# Altium footprint library Connector_PinSocket_2.54mm.PcbLib: 278 footprints (part 11 of 18)
Each footprint in its own frame and in the unit in brackets; x right, y up, seen from the top. Pads: shape width x height; smd on the part's side, far side on the other; paste and mask are expansions set on the pad; w line width, h text height; cw(c..) or ccw(c..) is an arc to the next point about the centre after c.
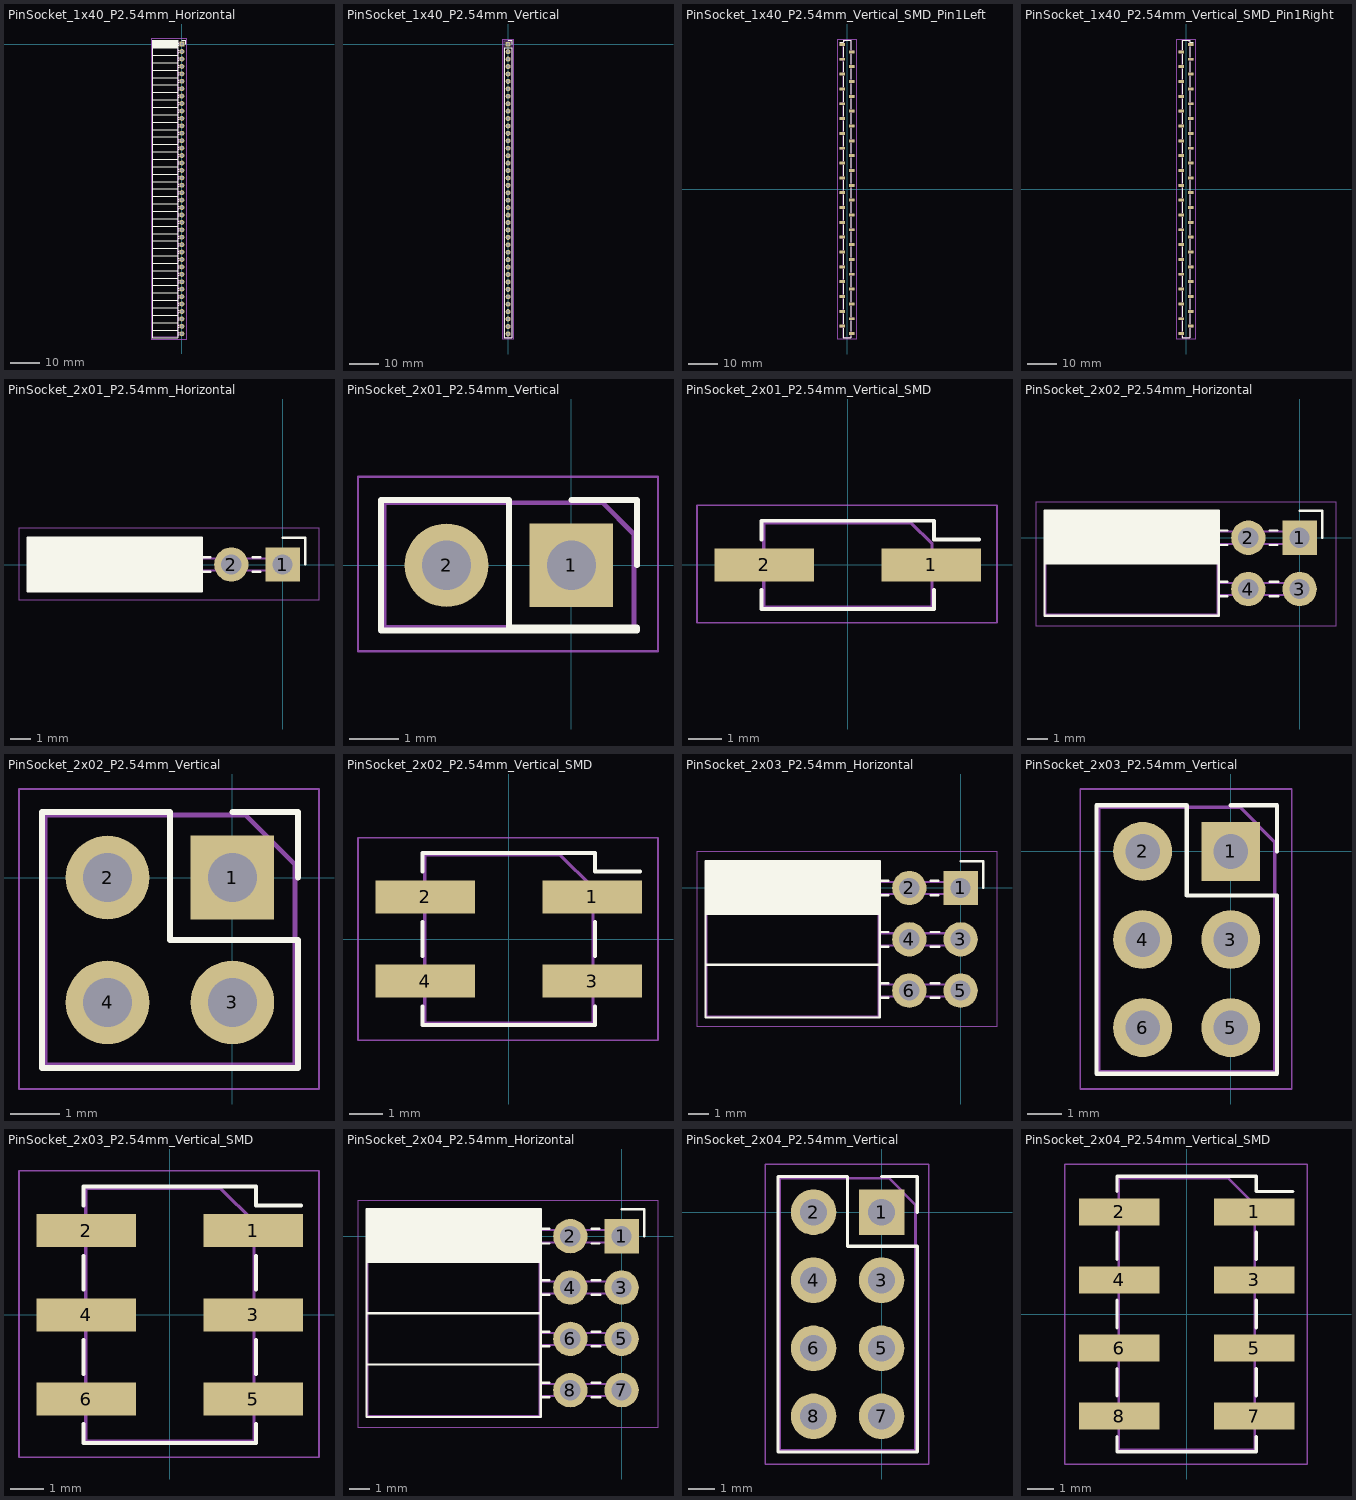
[diagram p10: the footprints below, top view; thin cyan lines are the x and y axes]

## PinSocket_1x40_P2.54mm_Horizontal [mm]
pads (40):
  rect 1.7x1.7 hole 1: 1(0,0)
  rrect100% 1.7x1.7 hole 1: 2(0,-2.54) 3(0,-5.08) 4(0,-7.62) 5(0,-10.16) 6(0,-12.7) 7(0,-15.24) 8(0,-17.78) 9(0,-20.32) 10(0,-22.86) 11(0,-25.4) 12(0,-27.94) 13(0,-30.48) 14(0,-33.02) 15(0,-35.56) 16(0,-38.1) 17(0,-40.64) 18(0,-43.18) 19(0,-45.72) 20(0,-48.26) 21(0,-50.8) 22(0,-53.34) 23(0,-55.88) 24(0,-58.42) 25(0,-60.96) 26(0,-63.5) 27(0,-66.04) 28(0,-68.58) 29(0,-71.12) 30(0,-73.66) 31(0,-76.2) 32(0,-78.74) 33(0,-81.28) 34(0,-83.82) 35(0,-86.36) 36(0,-88.9) 37(0,-91.44) 38(0,-93.98) 39(0,-96.52) 40(0,-99.06)
F.SilkS:
  lines w0.12: -10.09,-97.79 -1.46,-97.79 ; -10.09,-95.25 -1.46,-95.25 ; -10.09,-92.71 -1.46,-92.71 ; -10.09,-90.17 -1.46,-90.17 ; -10.09,-87.63 -1.46,-87.63 ; -10.09,-85.09 -1.46,-85.09 ; -10.09,-82.55 -1.46,-82.55 ; -10.09,-80.01 -1.46,-80.01 ; -10.09,-77.47 -1.46,-77.47 ; -10.09,-74.93 -1.46,-74.93 ; -10.09,-72.39 -1.46,-72.39 ; -10.09,-69.85 -1.46,-69.85 ; -10.09,-67.31 -1.46,-67.31 ; -10.09,-64.77 -1.46,-64.77 ; -10.09,-62.23 -1.46,-62.23 ; -10.09,-59.69 -1.46,-59.69 ; -10.09,-57.15 -1.46,-57.15 ; -10.09,-54.61 -1.46,-54.61 ; -10.09,-52.07 -1.46,-52.07 ; -10.09,-49.53 -1.46,-49.53 ; -10.09,-46.99 -1.46,-46.99 ; -10.09,-44.45 -1.46,-44.45 ; -10.09,-41.91 -1.46,-41.91 ; -10.09,-39.37 -1.46,-39.37 ; -10.09,-36.83 -1.46,-36.83 ; -10.09,-34.29 -1.46,-34.29 ; -10.09,-31.75 -1.46,-31.75 ; -10.09,-29.21 -1.46,-29.21 ; -10.09,-26.67 -1.46,-26.67 ; -10.09,-24.13 -1.46,-24.13 ; -10.09,-21.59 -1.46,-21.59 ; -10.09,-19.05 -1.46,-19.05 ; -10.09,-16.51 -1.46,-16.51 ; -10.09,-13.97 -1.46,-13.97 ; -10.09,-11.43 -1.46,-11.43 ; -10.09,-8.89 -1.46,-8.89 ; -10.09,-6.35 -1.46,-6.35 ; -10.09,-3.81 -1.46,-3.81 ; -10.09,-1.27 -1.46,-1.27 ; -10.09,-1.152 -1.46,-1.152 ; -10.09,-1.034 -1.46,-1.034 ; -10.09,-0.916 -1.46,-0.916 ; -10.09,-0.798 -1.46,-0.798 ; -10.09,-0.68 -1.46,-0.68 ; -10.09,-0.561 -1.46,-0.561 ; -10.09,-0.443 -1.46,-0.443 ; -10.09,-0.325 -1.46,-0.325 ; -10.09,-0.207 -1.46,-0.207 ; -10.09,-0.089 -1.46,-0.089 ; -10.09,0.029 -1.46,0.029 ; -10.09,0.147 -1.46,0.147 ; -10.09,0.265 -1.46,0.265 ; -10.09,0.383 -1.46,0.383 ; -10.09,0.501 -1.46,0.501 ; -10.09,0.62 -1.46,0.62 ; -10.09,0.738 -1.46,0.738 ; -10.09,0.856 -1.46,0.856 ; -10.09,0.974 -1.46,0.974 ; -10.09,1.092 -1.46,1.092 ; -10.09,1.21 -1.46,1.21 ; -1.46,-99.42 -1.05,-99.42 ; -1.46,-98.7 -1.05,-98.7 ; -1.46,-96.88 -1.05,-96.88 ; -1.46,-96.16 -1.05,-96.16 ; -1.46,-94.34 -1.05,-94.34 ; -1.46,-93.62 -1.05,-93.62 ; -1.46,-91.8 -1.05,-91.8 ; -1.46,-91.08 -1.05,-91.08 ; -1.46,-89.26 -1.05,-89.26 ; -1.46,-88.54 -1.05,-88.54 ; -1.46,-86.72 -1.05,-86.72 ; -1.46,-86 -1.05,-86 ; -1.46,-84.18 -1.05,-84.18 ; -1.46,-83.46 -1.05,-83.46 ; -1.46,-81.64 -1.05,-81.64 ; -1.46,-80.92 -1.05,-80.92 ; -1.46,-79.1 -1.05,-79.1 ; -1.46,-78.38 -1.05,-78.38 ; -1.46,-76.56 -1.05,-76.56 ; -1.46,-75.84 -1.05,-75.84 ; -1.46,-74.02 -1.05,-74.02 ; -1.46,-73.3 -1.05,-73.3 ; -1.46,-71.48 -1.05,-71.48 ; -1.46,-70.76 -1.05,-70.76 ; -1.46,-68.94 -1.05,-68.94 ; -1.46,-68.22 -1.05,-68.22 ; -1.46,-66.4 -1.05,-66.4 ; -1.46,-65.68 -1.05,-65.68 ; -1.46,-63.86 -1.05,-63.86 ; -1.46,-63.14 -1.05,-63.14 ; -1.46,-61.32 -1.05,-61.32 ; -1.46,-60.6 -1.05,-60.6 ; -1.46,-58.78 -1.05,-58.78 ; -1.46,-58.06 -1.05,-58.06 ; -1.46,-56.24 -1.05,-56.24 ; -1.46,-55.52 -1.05,-55.52 ; -1.46,-53.7 -1.05,-53.7 ; -1.46,-52.98 -1.05,-52.98 ; -1.46,-51.16 -1.05,-51.16 ; -1.46,-50.44 -1.05,-50.44 ; -1.46,-48.62 -1.05,-48.62 ; -1.46,-47.9 -1.05,-47.9 ; -1.46,-46.08 -1.05,-46.08 ; -1.46,-45.36 -1.05,-45.36 ; -1.46,-43.54 -1.05,-43.54 ; -1.46,-42.82 -1.05,-42.82 ; -1.46,-41 -1.05,-41 ; -1.46,-40.28 -1.05,-40.28 ; -1.46,-38.46 -1.05,-38.46 ; -1.46,-37.74 -1.05,-37.74 ; -1.46,-35.92 -1.05,-35.92 ; -1.46,-35.2 -1.05,-35.2 ; -1.46,-33.38 -1.05,-33.38 ; -1.46,-32.66 -1.05,-32.66 ; -1.46,-30.84 -1.05,-30.84 ; -1.46,-30.12 -1.05,-30.12 ; -1.46,-28.3 -1.05,-28.3 ; -1.46,-27.58 -1.05,-27.58 ; -1.46,-25.76 -1.05,-25.76 ; -1.46,-25.04 -1.05,-25.04 ; -1.46,-23.22 -1.05,-23.22 ; -1.46,-22.5 -1.05,-22.5 ; -1.46,-20.68 -1.05,-20.68 ; -1.46,-19.96 -1.05,-19.96 ; -1.46,-18.14 -1.05,-18.14 ; -1.46,-17.42 -1.05,-17.42 ; -1.46,-15.6 -1.05,-15.6 ; -1.46,-14.88 -1.05,-14.88 ; -1.46,-13.06 -1.05,-13.06 ; -1.46,-12.34 -1.05,-12.34 ; -1.46,-10.52 -1.05,-10.52 ; -1.46,-9.8 -1.05,-9.8 ; -1.46,-7.98 -1.05,-7.98 ; -1.46,-7.26 -1.05,-7.26 ; -1.46,-5.44 -1.05,-5.44 ; -1.46,-4.72 -1.05,-4.72 ; -1.46,-2.9 -1.05,-2.9 ; -1.46,-2.18 -1.05,-2.18 ; -1.46,-0.36 -1.11,-0.36 ; -1.46,0.36 -1.11,0.36 ; 0,1.33 1.11,1.33 1.11,0 ; -10.09,-100.39 -1.46,-100.39 -1.46,1.33 -10.09,1.33 -10.09,-100.39
F.CrtYd:
  lines w0.05: -10.55,-100.85 1.75,-100.85 1.75,1.75 -10.55,1.75 -10.55,-100.85
F.Fab:
  lines w0.1: -1.52,-99.36 0,-99.36 0,-98.76 -1.52,-98.76 ; -1.52,-96.82 0,-96.82 0,-96.22 -1.52,-96.22 ; -1.52,-94.28 0,-94.28 0,-93.68 -1.52,-93.68 ; -1.52,-91.74 0,-91.74 0,-91.14 -1.52,-91.14 ; -1.52,-89.2 0,-89.2 0,-88.6 -1.52,-88.6 ; -1.52,-86.66 0,-86.66 0,-86.06 -1.52,-86.06 ; -1.52,-84.12 0,-84.12 0,-83.52 -1.52,-83.52 ; -1.52,-81.58 0,-81.58 0,-80.98 -1.52,-80.98 ; -1.52,-79.04 0,-79.04 0,-78.44 -1.52,-78.44 ; -1.52,-76.5 0,-76.5 0,-75.9 -1.52,-75.9 ; -1.52,-73.96 0,-73.96 0,-73.36 -1.52,-73.36 ; -1.52,-71.42 0,-71.42 0,-70.82 -1.52,-70.82 ; -1.52,-68.88 0,-68.88 0,-68.28 -1.52,-68.28 ; -1.52,-66.34 0,-66.34 0,-65.74 -1.52,-65.74 ; -1.52,-63.8 0,-63.8 0,-63.2 -1.52,-63.2 ; -1.52,-61.26 0,-61.26 0,-60.66 -1.52,-60.66 ; -1.52,-58.72 0,-58.72 0,-58.12 -1.52,-58.12 ; -1.52,-56.18 0,-56.18 0,-55.58 -1.52,-55.58 ; -1.52,-53.64 0,-53.64 0,-53.04 -1.52,-53.04 ; -1.52,-51.1 0,-51.1 0,-50.5 -1.52,-50.5 ; -1.52,-48.56 0,-48.56 0,-47.96 -1.52,-47.96 ; -1.52,-46.02 0,-46.02 0,-45.42 -1.52,-45.42 ; -1.52,-43.48 0,-43.48 0,-42.88 -1.52,-42.88 ; -1.52,-40.94 0,-40.94 0,-40.34 -1.52,-40.34 ; -1.52,-38.4 0,-38.4 0,-37.8 -1.52,-37.8 ; -1.52,-35.86 0,-35.86 0,-35.26 -1.52,-35.26 ; -1.52,-33.32 0,-33.32 0,-32.72 -1.52,-32.72 ; -1.52,-30.78 0,-30.78 0,-30.18 -1.52,-30.18 ; -1.52,-28.24 0,-28.24 0,-27.64 -1.52,-27.64 ; -1.52,-25.7 0,-25.7 0,-25.1 -1.52,-25.1 ; -1.52,-23.16 0,-23.16 0,-22.56 -1.52,-22.56 ; -1.52,-20.62 0,-20.62 0,-20.02 -1.52,-20.02 ; -1.52,-18.08 0,-18.08 0,-17.48 -1.52,-17.48 ; -1.52,-15.54 0,-15.54 0,-14.94 -1.52,-14.94 ; -1.52,-13 0,-13 0,-12.4 -1.52,-12.4 ; -1.52,-10.46 0,-10.46 0,-9.86 -1.52,-9.86 ; -1.52,-7.92 0,-7.92 0,-7.32 -1.52,-7.32 ; -1.52,-5.38 0,-5.38 0,-4.78 -1.52,-4.78 ; -1.52,-2.84 0,-2.84 0,-2.24 -1.52,-2.24 ; -1.52,-0.3 0,-0.3 0,0.3 -1.52,0.3 ; -1.52,0.3 -2.49,1.27 -10.03,1.27 -10.03,-100.33 -1.52,-100.33 -1.52,0.3
  text "'.Designator'" at -4.935,-53.577 h1

## PinSocket_1x40_P2.54mm_Vertical [mm]
pads (40):
  rect 1.7x1.7 hole 1: 1(0,0)
  rrect100% 1.7x1.7 hole 1: 2(0,-2.54) 3(0,-5.08) 4(0,-7.62) 5(0,-10.16) 6(0,-12.7) 7(0,-15.24) 8(0,-17.78) 9(0,-20.32) 10(0,-22.86) 11(0,-25.4) 12(0,-27.94) 13(0,-30.48) 14(0,-33.02) 15(0,-35.56) 16(0,-38.1) 17(0,-40.64) 18(0,-43.18) 19(0,-45.72) 20(0,-48.26) 21(0,-50.8) 22(0,-53.34) 23(0,-55.88) 24(0,-58.42) 25(0,-60.96) 26(0,-63.5) 27(0,-66.04) 28(0,-68.58) 29(0,-71.12) 30(0,-73.66) 31(0,-76.2) 32(0,-78.74) 33(0,-81.28) 34(0,-83.82) 35(0,-86.36) 36(0,-88.9) 37(0,-91.44) 38(0,-93.98) 39(0,-96.52) 40(0,-99.06)
F.SilkS:
  lines w0.12: 0,1.33 1.33,1.33 1.33,0 ; -1.33,-100.39 1.33,-100.39 1.33,-1.27 -1.33,-1.27 -1.33,-100.39
F.CrtYd:
  lines w0.05: -1.8,-100.8 -1.8,1.8 1.75,1.8 1.75,-100.8 -1.8,-100.8
F.Fab:
  lines w0.1: -1.27,-100.33 1.27,-100.33 1.27,0.635 0.635,1.27 -1.27,1.27 -1.27,-100.33
  text "'.Designator'" at 0.84,-53.577 h1

## PinSocket_1x40_P2.54mm_Vertical_SMD_Pin1Left [mm]
pads (40):
  rect 1.9x1 smd: 1(-1.65,49.53) 2(1.65,46.99) 3(-1.65,44.45) 4(1.65,41.91) 5(-1.65,39.37) 6(1.65,36.83) 7(-1.65,34.29) 8(1.65,31.75) 9(-1.65,29.21) 10(1.65,26.67) 11(-1.65,24.13) 12(1.65,21.59) 13(-1.65,19.05) 14(1.65,16.51) 15(-1.65,13.97) 16(1.65,11.43) 17(-1.65,8.89) 18(1.65,6.35) 19(-1.65,3.81) 20(1.65,1.27) 21(-1.65,-1.27) 22(1.65,-3.81) 23(-1.65,-6.35) 24(1.65,-8.89) 25(-1.65,-11.43) 26(1.65,-13.97) 27(-1.65,-16.51) 28(1.65,-19.05) 29(-1.65,-21.59) 30(1.65,-24.13) 31(-1.65,-26.67) 32(1.65,-29.21) 33(-1.65,-31.75) 34(1.65,-34.29) 35(-1.65,-36.83) 36(1.65,-39.37) 37(-1.65,-41.91) 38(1.65,-44.45) 39(-1.65,-46.99) 40(1.65,-49.53)
F.SilkS:
  lines w0.12: -2.54,50.29 -1.33,50.29 -1.33,50.96 1.33,50.96 1.33,47.75 ; -1.33,-47.75 -1.33,-50.96 1.33,-50.96 1.33,-50.29 ; -1.33,-46.23 -1.33,-42.67 ; -1.33,-41.15 -1.33,-37.59 ; -1.33,-36.07 -1.33,-32.51 ; -1.33,-30.99 -1.33,-27.43 ; -1.33,-25.91 -1.33,-22.35 ; -1.33,-20.83 -1.33,-17.27 ; -1.33,-15.75 -1.33,-12.19 ; -1.33,-10.67 -1.33,-7.11 ; -1.33,-5.59 -1.33,-2.03 ; -1.33,-0.51 -1.33,3.05 ; -1.33,4.57 -1.33,8.13 ; -1.33,9.65 -1.33,13.21 ; -1.33,14.73 -1.33,18.29 ; -1.33,19.81 -1.33,23.37 ; -1.33,24.89 -1.33,28.45 ; -1.33,29.97 -1.33,33.53 ; -1.33,35.05 -1.33,38.61 ; -1.33,40.13 -1.33,43.69 ; -1.33,45.21 -1.33,48.77 ; 1.33,-48.77 1.33,-45.21 ; 1.33,-43.69 1.33,-40.13 ; 1.33,-38.61 1.33,-35.05 ; 1.33,-33.53 1.33,-29.97 ; 1.33,-28.45 1.33,-24.89 ; 1.33,-23.37 1.33,-19.81 ; 1.33,-18.29 1.33,-14.73 ; 1.33,-13.21 1.33,-9.65 ; 1.33,-8.13 1.33,-4.57 ; 1.33,-3.05 1.33,0.51 ; 1.33,2.03 1.33,5.59 ; 1.33,7.11 1.33,10.67 ; 1.33,12.19 1.33,15.75 ; 1.33,17.27 1.33,20.83 ; 1.33,22.35 1.33,25.91 ; 1.33,27.43 1.33,30.99 ; 1.33,32.51 1.33,36.07 ; 1.33,37.59 1.33,41.15 ; 1.33,42.67 1.33,46.23
F.CrtYd:
  lines w0.05: -3.1,-51.4 -3.1,51.4 3.1,51.4 3.1,-51.4 -3.1,-51.4
F.Fab:
  lines w0.1: -1.27,-47.29 -2.27,-47.29 -2.27,-46.69 -1.27,-46.69 ; -1.27,-42.21 -2.27,-42.21 -2.27,-41.61 -1.27,-41.61 ; -1.27,-37.13 -2.27,-37.13 -2.27,-36.53 -1.27,-36.53 ; -1.27,-32.05 -2.27,-32.05 -2.27,-31.45 -1.27,-31.45 ; -1.27,-26.97 -2.27,-26.97 -2.27,-26.37 -1.27,-26.37 ; -1.27,-21.89 -2.27,-21.89 -2.27,-21.29 -1.27,-21.29 ; -1.27,-16.81 -2.27,-16.81 -2.27,-16.21 -1.27,-16.21 ; -1.27,-11.73 -2.27,-11.73 -2.27,-11.13 -1.27,-11.13 ; -1.27,-6.65 -2.27,-6.65 -2.27,-6.05 -1.27,-6.05 ; -1.27,-1.57 -2.27,-1.57 -2.27,-0.97 -1.27,-0.97 ; -1.27,3.51 -2.27,3.51 -2.27,4.11 -1.27,4.11 ; -1.27,8.59 -2.27,8.59 -2.27,9.19 -1.27,9.19 ; -1.27,13.67 -2.27,13.67 -2.27,14.27 -1.27,14.27 ; -1.27,18.75 -2.27,18.75 -2.27,19.35 -1.27,19.35 ; -1.27,23.83 -2.27,23.83 -2.27,24.43 -1.27,24.43 ; -1.27,28.91 -2.27,28.91 -2.27,29.51 -1.27,29.51 ; -1.27,33.99 -2.27,33.99 -2.27,34.59 -1.27,34.59 ; -1.27,39.07 -2.27,39.07 -2.27,39.67 -1.27,39.67 ; -1.27,44.15 -2.27,44.15 -2.27,44.75 -1.27,44.75 ; -1.27,49.23 -2.27,49.23 -2.27,49.83 -1.27,49.83 ; 1.27,-49.83 2.27,-49.83 2.27,-49.23 1.27,-49.23 ; 1.27,-44.75 2.27,-44.75 2.27,-44.15 1.27,-44.15 ; 1.27,-39.67 2.27,-39.67 2.27,-39.07 1.27,-39.07 ; 1.27,-34.59 2.27,-34.59 2.27,-33.99 1.27,-33.99 ; 1.27,-29.51 2.27,-29.51 2.27,-28.91 1.27,-28.91 ; 1.27,-24.43 2.27,-24.43 2.27,-23.83 1.27,-23.83 ; 1.27,-19.35 2.27,-19.35 2.27,-18.75 1.27,-18.75 ; 1.27,-14.27 2.27,-14.27 2.27,-13.67 1.27,-13.67 ; 1.27,-9.19 2.27,-9.19 2.27,-8.59 1.27,-8.59 ; 1.27,-4.11 2.27,-4.11 2.27,-3.51 1.27,-3.51 ; 1.27,0.97 2.27,0.97 2.27,1.57 1.27,1.57 ; 1.27,6.05 2.27,6.05 2.27,6.65 1.27,6.65 ; 1.27,11.13 2.27,11.13 2.27,11.73 1.27,11.73 ; 1.27,16.21 2.27,16.21 2.27,16.81 1.27,16.81 ; 1.27,21.29 2.27,21.29 2.27,21.89 1.27,21.89 ; 1.27,26.37 2.27,26.37 2.27,26.97 1.27,26.97 ; 1.27,31.45 2.27,31.45 2.27,32.05 1.27,32.05 ; 1.27,36.53 2.27,36.53 2.27,37.13 1.27,37.13 ; 1.27,41.61 2.27,41.61 2.27,42.21 1.27,42.21 ; 1.27,46.69 2.27,46.69 2.27,47.29 1.27,47.29 ; -1.27,-50.9 1.27,-50.9 1.27,50.9 -0.635,50.9 -1.27,50.265 -1.27,-50.9
  text "'.Designator'" at 0.84,-4.047 h1

## PinSocket_1x40_P2.54mm_Vertical_SMD_Pin1Right [mm]
pads (40):
  rect 1.9x1 smd: 1(1.65,49.53) 2(-1.65,46.99) 3(1.65,44.45) 4(-1.65,41.91) 5(1.65,39.37) 6(-1.65,36.83) 7(1.65,34.29) 8(-1.65,31.75) 9(1.65,29.21) 10(-1.65,26.67) 11(1.65,24.13) 12(-1.65,21.59) 13(1.65,19.05) 14(-1.65,16.51) 15(1.65,13.97) 16(-1.65,11.43) 17(1.65,8.89) 18(-1.65,6.35) 19(1.65,3.81) 20(-1.65,1.27) 21(1.65,-1.27) 22(-1.65,-3.81) 23(1.65,-6.35) 24(-1.65,-8.89) 25(1.65,-11.43) 26(-1.65,-13.97) 27(1.65,-16.51) 28(-1.65,-19.05) 29(1.65,-21.59) 30(-1.65,-24.13) 31(1.65,-26.67) 32(-1.65,-29.21) 33(1.65,-31.75) 34(-1.65,-34.29) 35(1.65,-36.83) 36(-1.65,-39.37) 37(1.65,-41.91) 38(-1.65,-44.45) 39(1.65,-46.99) 40(-1.65,-49.53)
F.SilkS:
  lines w0.12: -1.33,-50.29 -1.33,-50.96 1.33,-50.96 1.33,-47.75 ; -1.33,-48.77 -1.33,-45.21 ; -1.33,-43.69 -1.33,-40.13 ; -1.33,-38.61 -1.33,-35.05 ; -1.33,-33.53 -1.33,-29.97 ; -1.33,-28.45 -1.33,-24.89 ; -1.33,-23.37 -1.33,-19.81 ; -1.33,-18.29 -1.33,-14.73 ; -1.33,-13.21 -1.33,-9.65 ; -1.33,-8.13 -1.33,-4.57 ; -1.33,-3.05 -1.33,0.51 ; -1.33,2.03 -1.33,5.59 ; -1.33,7.11 -1.33,10.67 ; -1.33,12.19 -1.33,15.75 ; -1.33,17.27 -1.33,20.83 ; -1.33,22.35 -1.33,25.91 ; -1.33,27.43 -1.33,30.99 ; -1.33,32.51 -1.33,36.07 ; -1.33,37.59 -1.33,41.15 ; -1.33,42.67 -1.33,46.23 ; -1.33,47.75 -1.33,50.96 1.33,50.96 1.33,50.29 2.54,50.29 ; 1.33,-46.23 1.33,-42.67 ; 1.33,-41.15 1.33,-37.59 ; 1.33,-36.07 1.33,-32.51 ; 1.33,-30.99 1.33,-27.43 ; 1.33,-25.91 1.33,-22.35 ; 1.33,-20.83 1.33,-17.27 ; 1.33,-15.75 1.33,-12.19 ; 1.33,-10.67 1.33,-7.11 ; 1.33,-5.59 1.33,-2.03 ; 1.33,-0.51 1.33,3.05 ; 1.33,4.57 1.33,8.13 ; 1.33,9.65 1.33,13.21 ; 1.33,14.73 1.33,18.29 ; 1.33,19.81 1.33,23.37 ; 1.33,24.89 1.33,28.45 ; 1.33,29.97 1.33,33.53 ; 1.33,35.05 1.33,38.61 ; 1.33,40.13 1.33,43.69 ; 1.33,45.21 1.33,48.77
F.CrtYd:
  lines w0.05: -3.1,-51.4 3.1,-51.4 3.1,51.4 -3.1,51.4 -3.1,-51.4
F.Fab:
  lines w0.1: -1.27,-49.83 -2.27,-49.83 -2.27,-49.23 -1.27,-49.23 ; -1.27,-44.75 -2.27,-44.75 -2.27,-44.15 -1.27,-44.15 ; -1.27,-39.67 -2.27,-39.67 -2.27,-39.07 -1.27,-39.07 ; -1.27,-34.59 -2.27,-34.59 -2.27,-33.99 -1.27,-33.99 ; -1.27,-29.51 -2.27,-29.51 -2.27,-28.91 -1.27,-28.91 ; -1.27,-24.43 -2.27,-24.43 -2.27,-23.83 -1.27,-23.83 ; -1.27,-19.35 -2.27,-19.35 -2.27,-18.75 -1.27,-18.75 ; -1.27,-14.27 -2.27,-14.27 -2.27,-13.67 -1.27,-13.67 ; -1.27,-9.19 -2.27,-9.19 -2.27,-8.59 -1.27,-8.59 ; -1.27,-4.11 -2.27,-4.11 -2.27,-3.51 -1.27,-3.51 ; -1.27,0.97 -2.27,0.97 -2.27,1.57 -1.27,1.57 ; -1.27,6.05 -2.27,6.05 -2.27,6.65 -1.27,6.65 ; -1.27,11.13 -2.27,11.13 -2.27,11.73 -1.27,11.73 ; -1.27,16.21 -2.27,16.21 -2.27,16.81 -1.27,16.81 ; -1.27,21.29 -2.27,21.29 -2.27,21.89 -1.27,21.89 ; -1.27,26.37 -2.27,26.37 -2.27,26.97 -1.27,26.97 ; -1.27,31.45 -2.27,31.45 -2.27,32.05 -1.27,32.05 ; -1.27,36.53 -2.27,36.53 -2.27,37.13 -1.27,37.13 ; -1.27,41.61 -2.27,41.61 -2.27,42.21 -1.27,42.21 ; -1.27,46.69 -2.27,46.69 -2.27,47.29 -1.27,47.29 ; 1.27,-47.29 2.27,-47.29 2.27,-46.69 1.27,-46.69 ; 1.27,-42.21 2.27,-42.21 2.27,-41.61 1.27,-41.61 ; 1.27,-37.13 2.27,-37.13 2.27,-36.53 1.27,-36.53 ; 1.27,-32.05 2.27,-32.05 2.27,-31.45 1.27,-31.45 ; 1.27,-26.97 2.27,-26.97 2.27,-26.37 1.27,-26.37 ; 1.27,-21.89 2.27,-21.89 2.27,-21.29 1.27,-21.29 ; 1.27,-16.81 2.27,-16.81 2.27,-16.21 1.27,-16.21 ; 1.27,-11.73 2.27,-11.73 2.27,-11.13 1.27,-11.13 ; 1.27,-6.65 2.27,-6.65 2.27,-6.05 1.27,-6.05 ; 1.27,-1.57 2.27,-1.57 2.27,-0.97 1.27,-0.97 ; 1.27,3.51 2.27,3.51 2.27,4.11 1.27,4.11 ; 1.27,8.59 2.27,8.59 2.27,9.19 1.27,9.19 ; 1.27,13.67 2.27,13.67 2.27,14.27 1.27,14.27 ; 1.27,18.75 2.27,18.75 2.27,19.35 1.27,19.35 ; 1.27,23.83 2.27,23.83 2.27,24.43 1.27,24.43 ; 1.27,28.91 2.27,28.91 2.27,29.51 1.27,29.51 ; 1.27,33.99 2.27,33.99 2.27,34.59 1.27,34.59 ; 1.27,39.07 2.27,39.07 2.27,39.67 1.27,39.67 ; 1.27,44.15 2.27,44.15 2.27,44.75 1.27,44.75 ; 1.27,49.23 2.27,49.23 2.27,49.83 1.27,49.83 ; -1.27,-50.9 1.27,-50.9 1.27,50.265 0.635,50.9 -1.27,50.9 -1.27,-50.9
  text "'.Designator'" at 0.84,-4.047 h1

## PinSocket_2x01_P2.54mm_Horizontal [mm]
pads (2):
  rect 1.7x1.7 hole 1: 1(0,0)
  rrect100% 1.7x1.7 hole 1: 2(-2.54,0)
F.SilkS:
  lines w0.12: -12.63,-1.215 -4,-1.215 ; -12.63,-1.099 -4,-1.099 ; -12.63,-0.984 -4,-0.984 ; -12.63,-0.868 -4,-0.868 ; -12.63,-0.753 -4,-0.753 ; -12.63,-0.637 -4,-0.637 ; -12.63,-0.522 -4,-0.522 ; -12.63,-0.406 -4,-0.406 ; -12.63,-0.291 -4,-0.291 ; -12.63,-0.175 -4,-0.175 ; -12.63,-0.06 -4,-0.06 ; -12.63,0.055 -4,0.055 ; -12.63,0.171 -4,0.171 ; -12.63,0.286 -4,0.286 ; -12.63,0.402 -4,0.402 ; -12.63,0.517 -4,0.517 ; -12.63,0.633 -4,0.633 ; -12.63,0.748 -4,0.748 ; -12.63,0.864 -4,0.864 ; -12.63,0.979 -4,0.979 ; -12.63,1.095 -4,1.095 ; -12.63,1.21 -4,1.21 ; -4,-0.36 -3.59,-0.36 ; -4,0.36 -3.59,0.36 ; -1.49,-0.36 -1.11,-0.36 ; -1.49,0.36 -1.11,0.36 ; 0,1.33 1.11,1.33 1.11,0 ; -12.63,-1.33 -4,-1.33 -4,1.33 -12.63,1.33 -12.63,-1.33
F.CrtYd:
  lines w0.05: -13.05,-1.75 1.8,-1.75 1.8,1.8 -13.05,1.8 -13.05,-1.75
F.Fab:
  lines w0.1: -4.06,-0.3 0,-0.3 0,0.3 -4.06,0.3 ; -12.57,-1.27 -12.57,1.27 -4.695,1.27 -4.06,0.635 -4.06,-1.27 -12.57,-1.27
  text "'.Designator'" at -12.362,-0.84 h1

## PinSocket_2x01_P2.54mm_Vertical [mm]
pads (2):
  rect 1.7x1.7 hole 1: 1(0,0)
  rrect100% 1.7x1.7 hole 1: 2(-2.54,0)
F.SilkS:
  lines w0.12: 0,1.33 1.33,1.33 1.33,0 ; -3.87,-1.33 -3.87,1.33 -1.27,1.33 -1.27,-1.27 1.33,-1.27 1.33,-1.33 -3.87,-1.33
F.CrtYd:
  lines w0.05: -4.34,-1.75 1.76,-1.75 1.76,1.8 -4.34,1.8 -4.34,-1.75
F.Fab:
  lines w0.1: -3.81,-1.27 -3.81,1.27 0.635,1.27 1.27,0.635 1.27,-1.27 -3.81,-1.27
  text "'.Designator'" at -5.317,-0.84 h1

## PinSocket_2x01_P2.54mm_Vertical_SMD [mm]
pads (2):
  rect 3x1 smd: 1(2.52,0) 2(-2.52,0)
F.SilkS:
  lines w0.12: -2.6,-0.76 -2.6,-1.33 2.6,-1.33 2.6,-0.76 ; -2.6,0.76 -2.6,1.33 2.6,1.33 2.6,0.76 3.96,0.76
F.CrtYd:
  lines w0.05: -4.55,-1.75 4.5,-1.75 4.5,1.8 -4.55,1.8 -4.55,-1.75
F.Fab:
  lines w0.1: -2.54,-0.32 -3.92,-0.32 -3.92,0.32 -2.54,0.32 ; 2.54,-0.32 3.92,-0.32 3.92,0.32 2.54,0.32 ; -2.54,-1.27 -2.54,1.27 1.905,1.27 2.54,0.635 2.54,-1.27 -2.54,-1.27
  text "'.Designator'" at -4.047,-0.84 h1

## PinSocket_2x02_P2.54mm_Horizontal [mm]
pads (4):
  rect 1.7x1.7 hole 1: 1(0,0)
  rrect100% 1.7x1.7 hole 1: 2(-2.54,0) 3(0,-2.54) 4(-2.54,-2.54)
F.SilkS:
  lines w0.12: -12.63,-1.27 -4,-1.27 ; -12.63,-1.152 -4,-1.152 ; -12.63,-1.034 -4,-1.034 ; -12.63,-0.916 -4,-0.916 ; -12.63,-0.798 -4,-0.798 ; -12.63,-0.68 -4,-0.68 ; -12.63,-0.561 -4,-0.561 ; -12.63,-0.443 -4,-0.443 ; -12.63,-0.325 -4,-0.325 ; -12.63,-0.207 -4,-0.207 ; -12.63,-0.089 -4,-0.089 ; -12.63,0.029 -4,0.029 ; -12.63,0.147 -4,0.147 ; -12.63,0.265 -4,0.265 ; -12.63,0.383 -4,0.383 ; -12.63,0.501 -4,0.501 ; -12.63,0.62 -4,0.62 ; -12.63,0.738 -4,0.738 ; -12.63,0.856 -4,0.856 ; -12.63,0.974 -4,0.974 ; -12.63,1.092 -4,1.092 ; -12.63,1.21 -4,1.21 ; -4,-2.9 -3.59,-2.9 ; -4,-2.18 -3.59,-2.18 ; -4,-0.36 -3.59,-0.36 ; -4,0.36 -3.59,0.36 ; -1.49,-2.9 -1.05,-2.9 ; -1.49,-2.18 -1.05,-2.18 ; -1.49,-0.36 -1.11,-0.36 ; -1.49,0.36 -1.11,0.36 ; 0,1.33 1.11,1.33 1.11,0 ; -12.63,-3.87 -12.63,1.33 -4,1.33 -4,-3.87 -12.63,-3.87
F.CrtYd:
  lines w0.05: -13.05,-4.35 1.8,-4.35 1.8,1.75 -13.05,1.75 -13.05,-4.35
F.Fab:
  lines w0.1: -4.06,-2.84 0,-2.84 0,-2.24 -4.06,-2.24 ; -4.06,-0.3 0,-0.3 0,0.3 -4.06,0.3 ; -4.06,0.3 -5.03,1.27 -12.57,1.27 -12.57,-3.81 -4.06,-3.81 -4.06,0.3
  text "'.Designator'" at -12.362,-2.11 h1

## PinSocket_2x02_P2.54mm_Vertical [mm]
pads (4):
  rect 1.7x1.7 hole 1: 1(0,0)
  rrect100% 1.7x1.7 hole 1: 2(-2.54,0) 3(0,-2.54) 4(-2.54,-2.54)
F.SilkS:
  lines w0.12: 0,1.33 1.33,1.33 1.33,0 ; -3.87,-3.87 -3.87,1.33 -1.27,1.33 -1.27,-1.27 1.33,-1.27 1.33,-3.87 -3.87,-3.87
F.CrtYd:
  lines w0.05: -4.34,-4.3 -4.34,1.8 1.76,1.8 1.76,-4.3 -4.34,-4.3
F.Fab:
  lines w0.1: -3.81,-3.81 1.27,-3.81 1.27,0.27 0.27,1.27 -3.81,1.27 -3.81,-3.81
  text "'.Designator'" at -0.43,-5.317 h1

## PinSocket_2x02_P2.54mm_Vertical_SMD [mm]
pads (4):
  rect 3x1 smd: 1(2.52,1.27) 2(-2.52,1.27) 3(2.52,-1.27) 4(-2.52,-1.27)
F.SilkS:
  lines w0.12: -2.6,-2.03 -2.6,-2.6 2.6,-2.6 2.6,-2.03 ; -2.6,-0.51 -2.6,0.51 ; -2.6,2.03 -2.6,2.6 2.6,2.6 2.6,2.03 3.96,2.03 ; 2.6,-0.51 2.6,0.51
F.CrtYd:
  lines w0.05: -4.55,-3.05 -4.55,3.05 4.5,3.05 4.5,-3.05 -4.55,-3.05
F.Fab:
  lines w0.1: -2.54,-1.59 -3.92,-1.59 -3.92,-0.95 -2.54,-0.95 ; -2.54,0.95 -3.92,0.95 -3.92,1.59 -2.54,1.59 ; 2.54,-1.59 3.92,-1.59 3.92,-0.95 2.54,-0.95 ; 2.54,0.95 3.92,0.95 3.92,1.59 2.54,1.59 ; -2.54,-2.54 2.54,-2.54 2.54,1.54 1.54,2.54 -2.54,2.54 -2.54,-2.54
  text "'.Designator'" at 0.84,-4.047 h1

## PinSocket_2x03_P2.54mm_Horizontal [mm]
pads (6):
  rect 1.7x1.7 hole 1: 1(0,0)
  rrect100% 1.7x1.7 hole 1: 2(-2.54,0) 3(0,-2.54) 4(-2.54,-2.54) 5(0,-5.08) 6(-2.54,-5.08)
F.SilkS:
  lines w0.12: -12.63,-3.81 -4,-3.81 ; -12.63,-1.27 -4,-1.27 ; -12.63,-1.152 -4,-1.152 ; -12.63,-1.034 -4,-1.034 ; -12.63,-0.916 -4,-0.916 ; -12.63,-0.798 -4,-0.798 ; -12.63,-0.68 -4,-0.68 ; -12.63,-0.561 -4,-0.561 ; -12.63,-0.443 -4,-0.443 ; -12.63,-0.325 -4,-0.325 ; -12.63,-0.207 -4,-0.207 ; -12.63,-0.089 -4,-0.089 ; -12.63,0.029 -4,0.029 ; -12.63,0.147 -4,0.147 ; -12.63,0.265 -4,0.265 ; -12.63,0.383 -4,0.383 ; -12.63,0.501 -4,0.501 ; -12.63,0.62 -4,0.62 ; -12.63,0.738 -4,0.738 ; -12.63,0.856 -4,0.856 ; -12.63,0.974 -4,0.974 ; -12.63,1.092 -4,1.092 ; -12.63,1.21 -4,1.21 ; -4,-5.44 -3.59,-5.44 ; -4,-4.72 -3.59,-4.72 ; -4,-2.9 -3.59,-2.9 ; -4,-2.18 -3.59,-2.18 ; -4,-0.36 -3.59,-0.36 ; -4,0.36 -3.59,0.36 ; -1.49,-5.44 -1.05,-5.44 ; -1.49,-4.72 -1.05,-4.72 ; -1.49,-2.9 -1.05,-2.9 ; -1.49,-2.18 -1.05,-2.18 ; -1.49,-0.36 -1.11,-0.36 ; -1.49,0.36 -1.11,0.36 ; 0,1.33 1.11,1.33 1.11,0 ; -12.63,-6.41 -4,-6.41 -4,1.33 -12.63,1.33 -12.63,-6.41
F.CrtYd:
  lines w0.05: -13.05,-6.85 1.8,-6.85 1.8,1.8 -13.05,1.8 -13.05,-6.85
F.Fab:
  lines w0.1: -4.06,-5.38 0,-5.38 0,-4.78 -4.06,-4.78 ; -4.06,-2.84 0,-2.84 0,-2.24 -4.06,-2.24 ; -4.06,-0.3 0,-0.3 0,0.3 -4.06,0.3 ; -4.06,0.3 -5.03,1.27 -12.57,1.27 -12.57,-6.35 -4.06,-6.35 -4.06,0.3
  text "'.Designator'" at -12.362,-3.38 h1

## PinSocket_2x03_P2.54mm_Vertical [mm]
pads (6):
  rect 1.7x1.7 hole 1: 1(0,0)
  rrect100% 1.7x1.7 hole 1: 2(-2.54,0) 3(0,-2.54) 4(-2.54,-2.54) 5(0,-5.08) 6(-2.54,-5.08)
F.SilkS:
  lines w0.12: 0,1.33 1.33,1.33 1.33,0 ; -3.87,-6.41 1.33,-6.41 1.33,-1.27 -1.27,-1.27 -1.27,1.33 -3.87,1.33 -3.87,-6.41
F.CrtYd:
  lines w0.05: -4.34,-6.85 1.76,-6.85 1.76,1.8 -4.34,1.8 -4.34,-6.85
F.Fab:
  lines w0.1: -3.81,-6.35 1.27,-6.35 1.27,0.27 0.27,1.27 -3.81,1.27 -3.81,-6.35
  text "'.Designator'" at -0.43,-6.587 h1

## PinSocket_2x03_P2.54mm_Vertical_SMD [mm]
pads (6):
  rect 3x1 smd: 1(2.52,2.54) 2(-2.52,2.54) 3(2.52,0) 4(-2.52,0) 5(2.52,-2.54) 6(-2.52,-2.54)
F.SilkS:
  lines w0.12: -2.6,-3.3 -2.6,-3.87 2.6,-3.87 2.6,-3.3 ; -2.6,-1.78 -2.6,-0.76 ; -2.6,0.76 -2.6,1.78 ; -2.6,3.3 -2.6,3.87 2.6,3.87 2.6,3.3 3.96,3.3 ; 2.6,-1.78 2.6,-0.76 ; 2.6,0.76 2.6,1.78
F.CrtYd:
  lines w0.05: -4.55,-4.3 -4.55,4.35 4.5,4.35 4.5,-4.3 -4.55,-4.3
F.Fab:
  lines w0.1: -2.54,-2.86 -3.92,-2.86 -3.92,-2.22 -2.54,-2.22 ; -2.54,-0.32 -3.92,-0.32 -3.92,0.32 -2.54,0.32 ; -2.54,2.22 -3.92,2.22 -3.92,2.86 -2.54,2.86 ; 2.54,-2.86 3.92,-2.86 3.92,-2.22 2.54,-2.22 ; 2.54,-0.32 3.92,-0.32 3.92,0.32 2.54,0.32 ; 2.54,2.22 3.92,2.22 3.92,2.86 2.54,2.86 ; -2.54,-3.81 2.54,-3.81 2.54,2.81 1.54,3.81 -2.54,3.81 -2.54,-3.81
  text "'.Designator'" at 0.84,-4.047 h1

## PinSocket_2x04_P2.54mm_Horizontal [mm]
pads (8):
  rect 1.7x1.7 hole 1: 1(0,0)
  rrect100% 1.7x1.7 hole 1: 2(-2.54,0) 3(0,-2.54) 4(-2.54,-2.54) 5(0,-5.08) 6(-2.54,-5.08) 7(0,-7.62) 8(-2.54,-7.62)
F.SilkS:
  lines w0.12: -12.63,-6.35 -4,-6.35 ; -12.63,-3.81 -4,-3.81 ; -12.63,-1.27 -4,-1.27 ; -12.63,-1.152 -4,-1.152 ; -12.63,-1.034 -4,-1.034 ; -12.63,-0.916 -4,-0.916 ; -12.63,-0.798 -4,-0.798 ; -12.63,-0.68 -4,-0.68 ; -12.63,-0.561 -4,-0.561 ; -12.63,-0.443 -4,-0.443 ; -12.63,-0.325 -4,-0.325 ; -12.63,-0.207 -4,-0.207 ; -12.63,-0.089 -4,-0.089 ; -12.63,0.029 -4,0.029 ; -12.63,0.147 -4,0.147 ; -12.63,0.265 -4,0.265 ; -12.63,0.383 -4,0.383 ; -12.63,0.501 -4,0.501 ; -12.63,0.62 -4,0.62 ; -12.63,0.738 -4,0.738 ; -12.63,0.856 -4,0.856 ; -12.63,0.974 -4,0.974 ; -12.63,1.092 -4,1.092 ; -12.63,1.21 -4,1.21 ; -4,-7.98 -3.59,-7.98 ; -4,-7.26 -3.59,-7.26 ; -4,-5.44 -3.59,-5.44 ; -4,-4.72 -3.59,-4.72 ; -4,-2.9 -3.59,-2.9 ; -4,-2.18 -3.59,-2.18 ; -4,-0.36 -3.59,-0.36 ; -4,0.36 -3.59,0.36 ; -1.49,-7.98 -1.05,-7.98 ; -1.49,-7.26 -1.05,-7.26 ; -1.49,-5.44 -1.05,-5.44 ; -1.49,-4.72 -1.05,-4.72 ; -1.49,-2.9 -1.05,-2.9 ; -1.49,-2.18 -1.05,-2.18 ; -1.49,-0.36 -1.11,-0.36 ; -1.49,0.36 -1.11,0.36 ; 0,1.33 1.11,1.33 1.11,0 ; -12.63,-8.95 -4,-8.95 -4,1.33 -12.63,1.33 -12.63,-8.95
F.CrtYd:
  lines w0.05: -13.05,-9.45 -13.05,1.75 1.8,1.75 1.8,-9.45 -13.05,-9.45
F.Fab:
  lines w0.1: -4.06,-7.92 0,-7.92 0,-7.32 -4.06,-7.32 ; -4.06,-5.38 0,-5.38 0,-4.78 -4.06,-4.78 ; -4.06,-2.84 0,-2.84 0,-2.24 -4.06,-2.24 ; -4.06,-0.3 0,-0.3 0,0.3 -4.06,0.3 ; -4.06,0.3 -4.06,-8.89 -12.57,-8.89 -12.57,1.27 -5.03,1.27 -4.06,0.3
  text "'.Designator'" at -7.475,-7.857 h1

## PinSocket_2x04_P2.54mm_Vertical [mm]
pads (8):
  rect 1.7x1.7 hole 1: 1(0,0)
  rrect100% 1.7x1.7 hole 1: 2(-2.54,0) 3(0,-2.54) 4(-2.54,-2.54) 5(0,-5.08) 6(-2.54,-5.08) 7(0,-7.62) 8(-2.54,-7.62)
F.SilkS:
  lines w0.12: 0,1.33 1.33,1.33 1.33,0 ; -3.87,-8.95 1.33,-8.95 1.33,-1.27 -1.27,-1.27 -1.27,1.33 -3.87,1.33 -3.87,-8.95
F.CrtYd:
  lines w0.05: -4.34,-9.4 1.76,-9.4 1.76,1.8 -4.34,1.8 -4.34,-9.4
F.Fab:
  lines w0.1: -3.81,-8.89 1.27,-8.89 1.27,0.27 0.27,1.27 -3.81,1.27 -3.81,-8.89
  text "'.Designator'" at -0.43,-7.857 h1

## PinSocket_2x04_P2.54mm_Vertical_SMD [mm]
pads (8):
  rect 3x1 smd: 1(2.52,3.81) 2(-2.52,3.81) 3(2.52,1.27) 4(-2.52,1.27) 5(2.52,-1.27) 6(-2.52,-1.27) 7(2.52,-3.81) 8(-2.52,-3.81)
F.SilkS:
  lines w0.12: -2.6,-4.57 -2.6,-5.14 2.6,-5.14 2.6,-4.57 ; -2.6,-3.05 -2.6,-2.03 ; -2.6,-0.51 -2.6,0.51 ; -2.6,2.03 -2.6,3.05 ; -2.6,4.57 -2.6,5.14 2.6,5.14 2.6,4.57 3.96,4.57 ; 2.6,-3.05 2.6,-2.03 ; 2.6,-0.51 2.6,0.51 ; 2.6,2.03 2.6,3.05
F.CrtYd:
  lines w0.05: -4.55,-5.6 4.5,-5.6 4.5,5.6 -4.55,5.6 -4.55,-5.6
F.Fab:
  lines w0.1: -2.54,-4.13 -3.92,-4.13 -3.92,-3.49 -2.54,-3.49 ; -2.54,-1.59 -3.92,-1.59 -3.92,-0.95 -2.54,-0.95 ; -2.54,0.95 -3.92,0.95 -3.92,1.59 -2.54,1.59 ; -2.54,3.49 -3.92,3.49 -3.92,4.13 -2.54,4.13 ; 2.54,-4.13 3.92,-4.13 3.92,-3.49 2.54,-3.49 ; 2.54,-1.59 3.92,-1.59 3.92,-0.95 2.54,-0.95 ; 2.54,0.95 3.92,0.95 3.92,1.59 2.54,1.59 ; 2.54,3.49 3.92,3.49 3.92,4.13 2.54,4.13 ; -2.54,-5.08 2.54,-5.08 2.54,4.08 1.54,5.08 -2.54,5.08 -2.54,-5.08
  text "'.Designator'" at 0.84,-4.047 h1